# Altium footprint library Reflow3D1411sep.PcbLib: 657 footprints (part 15 of 42)
Each footprint in its own frame and in the unit in brackets; x right, y up, seen from the top. Pads: shape width x height; smd on the part's side, far side on the other; paste and mask are expansions set on the pad; w line width, h text height; cw(c..) or ccw(c..) is an arc to the next point about the centre after c.
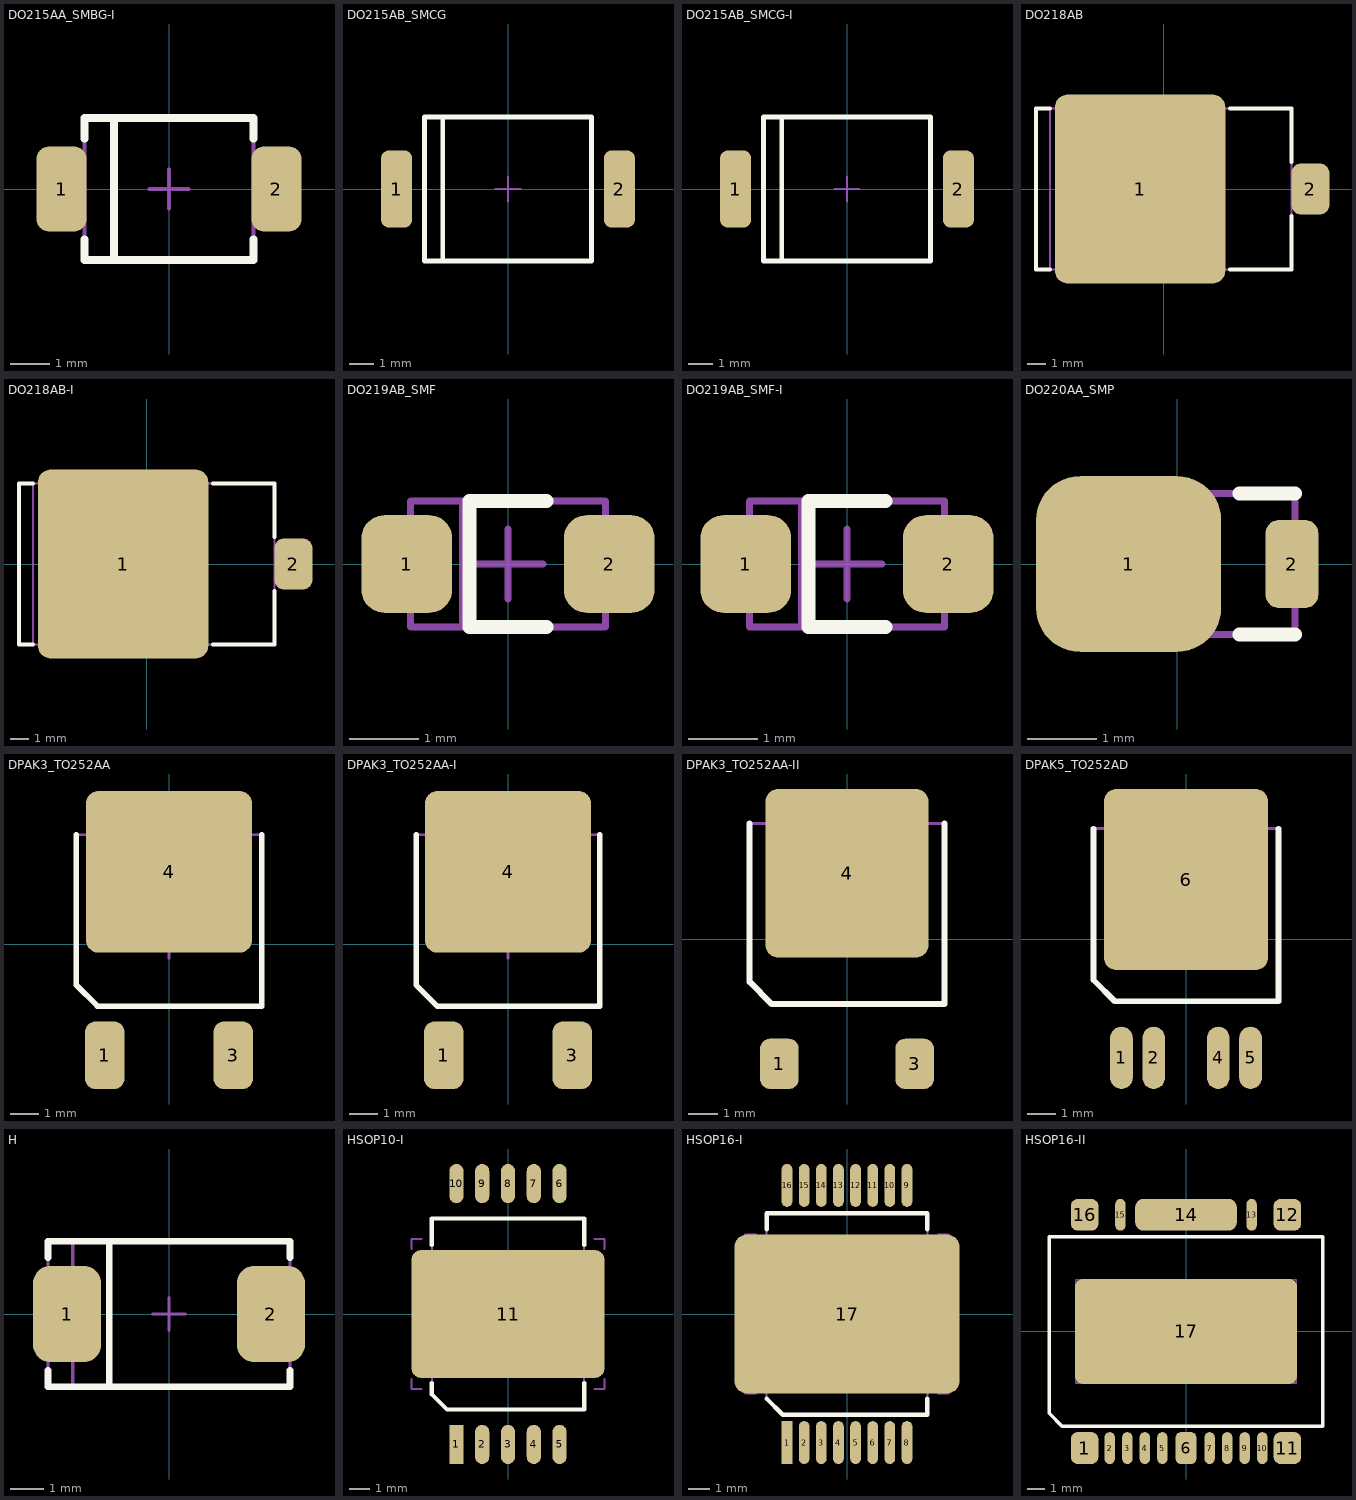
[diagram p14: the footprints below, top view; thin cyan lines are the x and y axes]

## DO215AA_SMBG-I [mm] "www.vishay.com, 88456.pdf; www.jedec.org, DO-215D.PDF"
height 2.3
pads (2):
  rrect50% 1.27x2.16 smd mask+0.075: 1(-2.73,0) 2(2.73,0)
Top Overlay:
  lines w0.2: -2.15,-1.275 -2.15,-1.8 2.15,-1.8 2.15,-1.275 ; -2.15,1.275 -2.15,1.8 2.15,1.8 2.15,1.275 ; -1.4,-1.8 -1.4,1.8
Mechanical 13:
  lines w0.1: -1.4,-1.8 -1.4,1.8 ; -2.15,-1.8 2.15,-1.8 2.15,1.8 -2.15,1.8 -2.15,-1.8
Mechanical 15:
  lines w0.1: -0.5,0 0.5,0 ; 0,-0.5 0,0.5
3D body: height 2.65, standoff 0, extent -2.3,-1.975 2.3,1.975

## DO215AB_SMCG [mm] "www.vishay.com, 88457.pdf"
height 2.28
pads (2):
  rrect50% 1.27x3.17 smd mask+0.075: 1(-4.57,0) 2(4.57,0)
Top Overlay:
  lines w0.2: -2.675,-2.95 -2.675,2.95 ; -3.43,-2.95 -3.43,2.95 3.43,2.95 3.43,-2.95 -3.43,-2.95
Mechanical 13:
  lines w0.1: -2.68,-2.95 -2.68,2.95 ; -3.43,-2.95 -3.43,2.95 3.43,2.95 3.43,-2.95 -3.43,-2.95
Mechanical 15:
  lines w0.1: -0.5,0 0.5,0 ; 0,-0.5 0,0.5
3D body: height 2.61, standoff 0, extent -3.555,-3.11 3.555,3.11

## DO215AB_SMCG-I [mm] "www.vishay.com, 88457.pdf; www.jedec.org, DO-214D.PDF"
height 2.3
pads (2):
  rrect50% 1.27x3.17 smd mask+0.075: 1(-4.57,0) 2(4.57,0)
Top Overlay:
  lines w0.2: -2.675,-2.95 -2.675,2.95 ; -3.425,-2.95 -3.425,2.95 3.425,2.95 3.425,-2.95 -3.425,-2.95
Mechanical 13:
  lines w0.1: -2.675,-2.95 -2.675,2.95 ; -3.425,-2.95 -3.425,2.95 3.425,2.95 3.425,-2.95 -3.425,-2.95
Mechanical 15:
  lines w0.1: -0.5,0 0.5,0 ; 0,-0.5 0,0.5
3D body: height 2.65, standoff 0, extent -3.575,-3.125 3.575,3.125

## DO218AB [mm] "www.vishay.com, sm6a27.pdf"
height 4.85
pads (2):
  rrect15% 9x10 smd mask+0.075: 1(-1.25,0)
  rrect50% 2x2.7 smd mask+0.075: 2(7.75,0)
Top Overlay:
  lines w0.2: -6,-4.25 -6.75,-4.25 -6.75,4.25 -6,4.25 ; 3.5,-4.25 6.75,-4.25 6.75,-1.425 ; 3.5,4.25 6.75,4.25 6.75,1.425
Mechanical 13:
  lines w0.1: -6,-4.25 -6,4.25 ; -6.75,-4.25 -6.75,4.25 6.75,4.25 6.75,-4.25 -6.75,-4.25
Mechanical 15:
  lines w0.1: -0.5,0 0.5,0 ; 0,-0.5 0,0.5
3D body: height 5, standoff 0, extent -6.85,-4.35 6.85,4.35

## DO218AB-I [mm] "www.vishay.com, sm6a27.pdf; www.jedec.org, DO-218b.pdf"
height 5
pads (2):
  rrect15% 9x10 smd mask+0.075: 1(-1.25,0)
  rrect50% 2x2.7 smd mask+0.075: 2(7.75,0)
Top Overlay:
  lines w0.2: -6,-4.25 -6.75,-4.25 -6.75,4.25 -6,4.25 ; 3.5,-4.25 6.75,-4.25 6.75,-1.425 ; 3.5,4.25 6.75,4.25 6.75,1.425
Mechanical 13:
  lines w0.1: -6,-4.25 -6,4.25 ; -6.75,-4.25 6.75,-4.25 6.75,4.25 -6.75,4.25 -6.75,-4.25
Mechanical 15:
  lines w0.1: -0.5,0 0.5,0 ; 0,-0.5 0,0.5
3D body: height 5.7, standoff 0, extent -6.9,-4.4 6.9,4.4

## DO219AB_SMF [mm] "www.vishay.com, sl02m.pdf"
height 0.98
pads (2):
  rrect50% 1.3x1.4 smd mask+0.075: 1(-1.45,0) 2(1.45,0)
Top Overlay:
  lines w0.2: 0.55,-0.9 -0.55,-0.9 -0.55,0.9 0.55,0.9
Mechanical 13:
  lines w0.1: -0.65,-0.9 -0.65,0.9 ; -1.4,-0.9 -1.4,0.9 1.4,0.9 1.4,-0.9 -1.4,-0.9
Mechanical 15:
  lines w0.1: -0.5,0 0.5,0 ; 0,-0.5 0,0.5
3D body: height 1.08, standoff 0, extent -1.45,-0.95 1.45,0.95

## DO219AB_SMF-I [mm] "www.vishay.com, sl02m.pdf; www.jedec.org, do-219b.pdf"
height 0.98
pads (2):
  rrect50% 1.3x1.4 smd mask+0.075: 1(-1.45,0) 2(1.45,0)
Top Overlay:
  lines w0.2: 0.55,-0.9 -0.55,-0.9 -0.55,0.9 0.55,0.9
Mechanical 13:
  lines w0.1: -0.65,-0.9 -0.65,0.9 ; -1.4,-0.9 1.4,-0.9 1.4,0.9 -1.4,0.9 -1.4,-0.9
Mechanical 15:
  lines w0.1: -0.5,0 0.5,0 ; 0,-0.5 0,0.5
3D body: height 1.15, standoff 0, extent -1.45,-0.95 1.45,0.95

## DO220AA_SMP [mm] "www.vishay.com, es1pb.pdf; www.jedec.org, DO-220B.pdf"
height 1
pads (2):
  rrect50% 2.67x2.54 smd mask+0.075: 1(-0.7,0)
  rrect50% 0.76x1.27 smd mask+0.075: 2(1.655,0)
Top Overlay:
  lines w0.2: 0.9,-1.015 1.7,-1.015 ; 0.9,1.015 1.7,1.015
Mechanical 13:
  lines w0.1: -0.95,-1.015 -0.95,1.015 ; -1.7,-1.015 -1.7,1.015 1.7,1.015 1.7,-1.015 -1.7,-1.015
Mechanical 15:
  lines w0.1: -0.5,0 0.5,0 ; 0,-0.5 0,0.5
3D body: height 1.15, standoff 0, extent -1.805,-1.09 1.805,1.09

## DPAK3_TO252AA [mm] "www.nxp.com, sot428_po.pdf, SOT428_fr.pdf"
height 2.3
pads (3):
  rrect50% 1.4x2.4 smd paste-25.4 mask+0.05: 1(-2.285,-3.95) 3(2.285,-3.95)
  rrect15% 5.9x5.75 smd paste-25.4 mask+0.05: 4(0,2.575)
Top Overlay:
  lines w0.2: -3.3,3.9 -3.3,-1.45 -2.55,-2.2 3.3,-2.2 3.3,3.9
Top Paste:
  region: -1.635,-4.1 -2.935,-4.1 -2.935,-5.1 -1.635,-5.1
  region: -1.1,0.75 -2.9,0.75 -2.9,-0.25 -1.1,-0.25
  region: -1.635,-2.8 -2.935,-2.8 -2.935,-3.8 -1.635,-3.8
  region: 2.935,-2.8 1.635,-2.8 1.635,-3.8 2.935,-3.8
  region: 2.935,-4.1 1.635,-4.1 1.635,-5.1 2.935,-5.1
  region: 0.9,0.75 -0.9,0.75 -0.9,-0.25 0.9,-0.25
  region: 2.9,0.75 1.1,0.75 1.1,-0.25 2.9,-0.25
  region: 2.9,5.4 1.1,5.4 1.1,4.4 2.9,4.4
  region: 0.9,5.4 -0.9,5.4 -0.9,4.4 0.9,4.4
  region: -1.1,5.4 -2.9,5.4 -2.9,4.4 -1.1,4.4
  region: 2.9,3.075 1.1,3.075 1.1,2.075 2.9,2.075
  region: 0.9,3.075 -0.9,3.075 -0.9,2.075 0.9,2.075
  region: -1.1,3.075 -2.9,3.075 -2.9,2.075 -1.1,2.075
Mechanical 13:
  lines w0.1: -3.3,-1.45 -3.3,3.9 3.3,3.9 3.3,-2.2 -2.55,-2.2 -3.3,-1.45
Mechanical 15:
  lines w0.1: -0.5,0 0.5,0 ; 0,-0.5 0,0.5
3D body: height 2.38, standoff 0, extent -3.365,-2.26 3.365,3.96

## DPAK3_TO252AA-I [mm] "www.nxp.com, SOT428_fr.pdf; www.onsemi.com, 369AA.PDF; www.jedec.org, TO-252E.pdf"
height 2.28
pads (3):
  rrect50% 1.4x2.4 smd paste-25.4 mask+0.05: 1(-2.285,-3.95) 3(2.285,-3.95)
  rrect15% 5.9x5.75 smd paste-25.4 mask+0.05: 4(0,2.575)
Top Overlay:
  lines w0.2: -3.27,3.9 -3.27,-1.45 -2.52,-2.2 3.27,-2.2 3.27,3.9
Top Paste:
  region: -1.635,-4.1 -2.935,-4.1 -2.935,-5.1 -1.635,-5.1
  region: -1.1,0.75 -2.9,0.75 -2.9,-0.25 -1.1,-0.25
  region: -1.635,-2.8 -2.935,-2.8 -2.935,-3.8 -1.635,-3.8
  region: 2.935,-2.8 1.635,-2.8 1.635,-3.8 2.935,-3.8
  region: 2.935,-4.1 1.635,-4.1 1.635,-5.1 2.935,-5.1
  region: 0.9,0.75 -0.9,0.75 -0.9,-0.25 0.9,-0.25
  region: 2.9,0.75 1.1,0.75 1.1,-0.25 2.9,-0.25
  region: 2.9,5.4 1.1,5.4 1.1,4.4 2.9,4.4
  region: 0.9,5.4 -0.9,5.4 -0.9,4.4 0.9,4.4
  region: -1.1,5.4 -2.9,5.4 -2.9,4.4 -1.1,4.4
  region: 2.9,3.075 1.1,3.075 1.1,2.075 2.9,2.075
  region: 0.9,3.075 -0.9,3.075 -0.9,2.075 0.9,2.075
  region: -1.1,3.075 -2.9,3.075 -2.9,2.075 -1.1,2.075
Mechanical 13:
  lines w0.1: -3.27,-1.45 -3.27,3.9 3.27,3.9 3.27,-2.2 -2.52,-2.2 -3.27,-1.45
Mechanical 15:
  lines w0.1: -0.5,0 0.5,0 ; 0,-0.5 0,0.5
3D body: height 2.38, standoff 0, extent -3.365,-2.26 3.365,3.96

## DPAK3_TO252AA-II [mm] "www.national.com, td03b.pdf; www.jedec.org, TO-252E.pdf; www.onsemi.com, SOLDERRM-D.PDF"
height 2.3
pads (3):
  rrect50% 1.3x1.7 smd mask+0.075: 1(-2.285,-4.22) 3(2.285,-4.22)
  rrect15% 5.5x5.7 smd paste-25.4 mask+0.075: 4(0,2.22)
Top Overlay:
  lines w0.2: -3.29,3.9 -3.29,-1.45 -2.54,-2.2 3.29,-2.2 3.29,3.9
Top Paste:
  region: -0.75,4.97 -2.65,4.97 -2.65,2.97 -0.75,2.97
  region: 2.65,4.97 0.75,4.97 0.75,2.97 2.65,2.97
  region: 2.65,1.47 0.75,1.47 0.75,-0.53 2.65,-0.53
  region: -0.75,1.47 -2.65,1.47 -2.65,-0.53 -0.75,-0.53
Mechanical 13:
  lines w0.1: -3.29,-1.45 -3.29,3.9 3.29,3.9 3.29,-2.2 -2.54,-2.2 -3.29,-1.45
Mechanical 15:
  lines w0.1: -0.5,0 0.5,0 ; 0,-0.5 0,0.5
3D body: height 2.38, standoff 0, extent -3.365,-2.26 3.365,3.96

## DPAK5_TO252AD [mm] "www.onsemi.com, 175AA.PDF, SOLDERRM-D.PDF; www.jedec.org, TO-252E.pdf"
height 2.28
pads (5):
  oval 0.8x2.2 smd mask+0.075: 1(-2.28,-4.2) 2(-1.14,-4.2) 4(1.14,-4.2) 5(2.28,-4.2)
  rrect15% 5.8x6.4 smd paste-25.4 mask+0.075: 6(0,2.1)
Top Overlay:
  lines w0.2: -3.27,3.9 -3.27,-1.45 -2.52,-2.2 3.27,-2.2 3.27,3.9
Top Paste:
  region: -2.8,1.3 -2.8,-1 -0.8,-1 -0.8,1.3
  region: 0.8,1.3 0.8,-1 2.8,-1 2.8,1.3
  region: 0.8,5.2 0.8,2.9 2.8,2.9 2.8,5.2
  region: -2.8,5.2 -2.8,2.9 -0.8,2.9 -0.8,5.2
Mechanical 13:
  lines w0.1: -3.27,-1.45 -3.27,3.9 3.27,3.9 3.27,-2.2 -2.52,-2.2 -3.27,-1.45
Mechanical 15:
  lines w0.1: -0.5,0 0.5,0 ; 0,-0.5 0,0.5
3D body: height 2.38, standoff 0, extent -3.365,-2.26 3.365,3.96

## H [mm] "www.nec-tokin.com, capacitors.pdf; http://www.ncc-matsuo.co.jp, 267m.pdf"
height 4.1
pads (2):
  rrect50% 2.05x2.9 smd mask+0.075: 1(-3.075,0) 2(3.075,0)
Top Overlay:
  lines w0.2: -3.65,-1.7 -3.65,-2.2 3.65,-2.2 3.65,-1.7 ; -3.65,1.7 -3.65,2.2 3.65,2.2 3.65,1.7 ; -1.8,-2.2 -1.8,2.2
Mechanical 13:
  lines w0.1: -2.9,-2.2 -2.9,2.2 ; -3.65,-2.2 3.65,-2.2 3.65,2.2 -3.65,2.2 -3.65,-2.2
Mechanical 15:
  lines w0.1: -0.5,0 0.5,0 ; 0,-0.5 0,0.5
3D body: height 4.3, standoff 0, extent -3.75,-2.3 3.75,2.3

## HSOP10-I [mm] "www.st.com, CD00001316.pdf; www.jedec.org, jesd51-5.pdf"
height 3.55
pads (11):
  rect 0.7x1.93 smd mask+0.075: 1(-2.54,-6.415)
  oval 0.7x1.93 smd mask+0.075: 2(-1.27,-6.415) 3(0,-6.415) 4(1.27,-6.415) 5(2.54,-6.415) 6(2.54,6.415) 7(1.27,6.415) 8(0,6.415) 9(-1.27,6.415) 10(-2.54,6.415)
  rrect15% 9.5x6.3 smd paste-25.4 mask+0.075: 11(0,0)
Top Overlay:
  lines w0.2: -3.75,-3.4 -3.75,-3.95 -3,-4.7 3.75,-4.7 3.75,-3.4 ; -3.75,3.4 -3.75,4.7 3.75,4.7 3.75,3.4
Top Paste:
  region: 0.5,0.5 -0.5,0.5 -0.5,-0.5 0.5,-0.5
  region: 0.5,1.7 -0.5,1.7 -0.5,0.7 0.5,0.7
  region: 0.5,2.9 -0.5,2.9 -0.5,1.9 0.5,1.9
  region: 0.5,-0.7 -0.5,-0.7 -0.5,-1.7 0.5,-1.7
  region: 0.5,-1.9 -0.5,-1.9 -0.5,-2.9 0.5,-2.9
  region: 1.7,-1.9 0.7,-1.9 0.7,-2.9 1.7,-2.9
  region: 1.7,-0.7 0.7,-0.7 0.7,-1.7 1.7,-1.7
  region: 1.7,2.9 0.7,2.9 0.7,1.9 1.7,1.9
  region: 1.7,1.7 0.7,1.7 0.7,0.7 1.7,0.7
  region: 1.7,0.5 0.7,0.5 0.7,-0.5 1.7,-0.5
  region: 2.9,-1.9 1.9,-1.9 1.9,-2.9 2.9,-2.9
  region: 2.9,-0.7 1.9,-0.7 1.9,-1.7 2.9,-1.7
  region: 2.9,2.9 1.9,2.9 1.9,1.9 2.9,1.9
  region: 2.9,1.7 1.9,1.7 1.9,0.7 2.9,0.7
  region: 2.9,0.5 1.9,0.5 1.9,-0.5 2.9,-0.5
  region: -0.7,-1.9 -1.7,-1.9 -1.7,-2.9 -0.7,-2.9
  region: -0.7,-0.7 -1.7,-0.7 -1.7,-1.7 -0.7,-1.7
  region: -0.7,2.9 -1.7,2.9 -1.7,1.9 -0.7,1.9
  region: -0.7,1.7 -1.7,1.7 -1.7,0.7 -0.7,0.7
  region: -0.7,0.5 -1.7,0.5 -1.7,-0.5 -0.7,-0.5
  region: -1.9,-1.9 -2.9,-1.9 -2.9,-2.9 -1.9,-2.9
  region: -1.9,-0.7 -2.9,-0.7 -2.9,-1.7 -1.9,-1.7
  region: -1.9,2.9 -2.9,2.9 -2.9,1.9 -1.9,1.9
  region: -1.9,1.7 -2.9,1.7 -2.9,0.7 -1.9,0.7
  region: -1.9,0.5 -2.9,0.5 -2.9,-0.5 -1.9,-0.5
  region: -3.1,-1.9 -4.1,-1.9 -4.1,-2.9 -3.1,-2.9
  region: -3.1,-0.7 -4.1,-0.7 -4.1,-1.7 -3.1,-1.7
  region: -3.1,2.9 -4.1,2.9 -4.1,1.9 -3.1,1.9
  region: -3.1,1.7 -4.1,1.7 -4.1,0.7 -3.1,0.7
  region: -3.1,0.5 -4.1,0.5 -4.1,-0.5 -3.1,-0.5
  region: 4.1,-1.9 3.1,-1.9 3.1,-2.9 4.1,-2.9
  region: 4.1,-0.7 3.1,-0.7 3.1,-1.7 4.1,-1.7
  region: 4.1,2.9 3.1,2.9 3.1,1.9 4.1,1.9
  region: 4.1,1.7 3.1,1.7 3.1,0.7 4.1,0.7
  region: 4.1,0.5 3.1,0.5 3.1,-0.5 4.1,-0.5
Mechanical 13:
  lines w0.1: -4.75,-3.2 -4.75,-3.7 -4.25,-3.7 ; -4.75,3.2 -4.75,3.7 -4.25,3.7 ; 4.25,-3.7 4.75,-3.7 4.75,-3.2 ; 4.25,3.7 4.75,3.7 4.75,3.2 ; -3.75,-3.95 -3,-4.7 3.75,-4.7 3.75,4.7 -3.75,4.7 -3.75,-3.95
Mechanical 15:
  lines w0.1: -0.5,0 0.5,0 ; 0,-0.5 0,0.5
3D body: height 3.75, standoff 0, extent -3.8,-4.75 3.8,4.75

## HSOP16-I [mm] "www.st.com, CD00269984.pdf; www.jedec.org, jesd51-5.pdf"
height 3.55
pads (17):
  rect 0.5x2 smd mask+0.075: 1(-2.8,-6)
  oval 0.5x2 smd mask+0.075: 2(-2,-6) 3(-1.2,-6) 4(-0.4,-6) 5(0.4,-6) 6(1.2,-6) 7(2,-6) 8(2.8,-6) 9(2.8,6) 10(2,6) 11(1.2,6) 12(0.4,6) 13(-0.4,6) 14(-1.2,6) 15(-2,6) 16(-2.8,6)
  rrect15% 10.5x7.4 smd paste-25.4 mask+0.075: 17(0,0)
Top Overlay:
  lines w0.2: -3.75,-3.95 -3,-4.7 3.75,-4.7 3.75,-3.95 ; -3.75,3.95 -3.75,4.7 3.75,4.7 3.75,3.95
Top Paste:
  region: 0.5,0.5 -0.5,0.5 -0.5,-0.5 0.5,-0.5
  region: 0.5,1.7 -0.5,1.7 -0.5,0.7 0.5,0.7
  region: 0.5,2.9 -0.5,2.9 -0.5,1.9 0.5,1.9
  region: 0.5,-0.7 -0.5,-0.7 -0.5,-1.7 0.5,-1.7
  region: 0.5,-1.9 -0.5,-1.9 -0.5,-2.9 0.5,-2.9
  region: 1.7,-1.9 0.7,-1.9 0.7,-2.9 1.7,-2.9
  region: 1.7,-0.7 0.7,-0.7 0.7,-1.7 1.7,-1.7
  region: 1.7,2.9 0.7,2.9 0.7,1.9 1.7,1.9
  region: 1.7,1.7 0.7,1.7 0.7,0.7 1.7,0.7
  region: 1.7,0.5 0.7,0.5 0.7,-0.5 1.7,-0.5
  region: 2.9,-1.9 1.9,-1.9 1.9,-2.9 2.9,-2.9
  region: 2.9,-0.7 1.9,-0.7 1.9,-1.7 2.9,-1.7
  region: 2.9,2.9 1.9,2.9 1.9,1.9 2.9,1.9
  region: 2.9,1.7 1.9,1.7 1.9,0.7 2.9,0.7
  region: 2.9,0.5 1.9,0.5 1.9,-0.5 2.9,-0.5
  region: -0.7,-1.9 -1.7,-1.9 -1.7,-2.9 -0.7,-2.9
  region: -0.7,-0.7 -1.7,-0.7 -1.7,-1.7 -0.7,-1.7
  region: -0.7,2.9 -1.7,2.9 -1.7,1.9 -0.7,1.9
  region: -0.7,1.7 -1.7,1.7 -1.7,0.7 -0.7,0.7
  region: -0.7,0.5 -1.7,0.5 -1.7,-0.5 -0.7,-0.5
  region: -1.9,-1.9 -2.9,-1.9 -2.9,-2.9 -1.9,-2.9
  region: -1.9,-0.7 -2.9,-0.7 -2.9,-1.7 -1.9,-1.7
  region: -1.9,2.9 -2.9,2.9 -2.9,1.9 -1.9,1.9
  region: -1.9,1.7 -2.9,1.7 -2.9,0.7 -1.9,0.7
  region: -1.9,0.5 -2.9,0.5 -2.9,-0.5 -1.9,-0.5
  region: -3.1,-1.9 -4.1,-1.9 -4.1,-2.9 -3.1,-2.9
  region: -3.1,-0.7 -4.1,-0.7 -4.1,-1.7 -3.1,-1.7
  region: -3.1,2.9 -4.1,2.9 -4.1,1.9 -3.1,1.9
  region: -3.1,1.7 -4.1,1.7 -4.1,0.7 -3.1,0.7
  region: -3.1,0.5 -4.1,0.5 -4.1,-0.5 -3.1,-0.5
  region: 4.1,-1.9 3.1,-1.9 3.1,-2.9 4.1,-2.9
  region: 4.1,-0.7 3.1,-0.7 3.1,-1.7 4.1,-1.7
  region: 4.1,2.9 3.1,2.9 3.1,1.9 4.1,1.9
  region: 4.1,1.7 3.1,1.7 3.1,0.7 4.1,0.7
  region: 4.1,0.5 3.1,0.5 3.1,-0.5 4.1,-0.5
Mechanical 13:
  lines w0.1: -4.75,-3.2 -4.75,-3.7 -4.25,-3.7 ; -4.75,3.2 -4.75,3.7 -4.25,3.7 ; 4.25,-3.7 4.75,-3.7 4.75,-3.2 ; 4.25,3.7 4.75,3.7 4.75,3.2 ; -3.75,-3.95 -3,-4.7 3.75,-4.7 3.75,4.7 -3.75,4.7 -3.75,-3.95
Mechanical 15:
  lines w0.1: -0.5,0 0.5,0 ; 0,-0.5 0,0.5
3D body: height 3.7, standoff 0, extent -3.8,-4.75 3.8,4.75

## HSOP16-II [mm] "www.nxp.com, sot822-1_po.pdf, SOT822-1_fr.pdf"
height 3.3
pads (17):
  rrect50% 1.6x1.85 smd mask+0.075: 1(-5.89,-6.775) 11(5.89,-6.775) 12(5.89,6.775) 16(-5.89,6.775)
  oval 0.6x1.85 smd mask+0.075: 2(-4.43,-6.775) 3(-3.41,-6.775) 4(-2.39,-6.775) 5(-1.37,-6.775) 7(1.37,-6.775) 8(2.39,-6.775) 9(3.41,-6.775) 10(4.43,-6.775) 13(3.81,6.775) 15(-3.81,6.775)
  rrect50% 1.2x1.85 smd mask+0.075: 6(0,-6.775)
  rrect50% 5.9x1.85 smd paste-25.4 mask+0.075: 14(0,6.775)
  rrect15% 12.9x6.1 smd paste-25.4 mask-0.075: 17(0,0)
Top Overlay:
  lines w0.2: -7.95,-4.75 -7.2,-5.5 7.95,-5.5 7.95,5.5 -7.95,5.5 -7.95,-4.75
Top Paste:
  region: 0.55,0.55 -0.55,0.55 -0.55,-0.55 0.55,-0.55
  region: 2.925,7.675 0.225,7.675 0.225,5.875 2.925,5.875
  region: -0.225,7.675 -2.925,7.675 -2.925,5.875 -0.225,5.875
  region: 2.05,0.55 0.95,0.55 0.95,-0.55 2.05,-0.55
  region: 0.55,2.05 -0.55,2.05 -0.55,0.95 0.55,0.95
  region: 2.05,2.05 0.95,2.05 0.95,0.95 2.05,0.95
  region: 0.55,-0.95 -0.55,-0.95 -0.55,-2.05 0.55,-2.05
  region: 2.05,-0.95 0.95,-0.95 0.95,-2.05 2.05,-2.05
  region: -0.95,-0.95 -2.05,-0.95 -2.05,-2.05 -0.95,-2.05
  region: -0.95,2.05 -2.05,2.05 -2.05,0.95 -0.95,0.95
  region: -0.95,0.55 -2.05,0.55 -2.05,-0.55 -0.95,-0.55
  region: -2.45,-0.95 -3.55,-0.95 -3.55,-2.05 -2.45,-2.05
  region: -2.45,2.05 -3.55,2.05 -3.55,0.95 -2.45,0.95
  region: -2.45,0.55 -3.55,0.55 -3.55,-0.55 -2.45,-0.55
  region: 3.55,-0.95 2.45,-0.95 2.45,-2.05 3.55,-2.05
  region: 3.55,2.05 2.45,2.05 2.45,0.95 3.55,0.95
  region: 3.55,0.55 2.45,0.55 2.45,-0.55 3.55,-0.55
Mechanical 13:
  lines w0.1: -6.4,-2.5 -6.4,-3 -5.9,-3 ; -6.4,2.5 -6.4,3 -5.9,3 ; 5.9,-3 6.4,-3 6.4,-2.5 ; 5.9,3 6.4,3 6.4,2.5 ; -7.95,-4.75 -7.95,5.5 7.95,5.5 7.95,-5.5 -7.2,-5.5 -7.95,-4.75
Mechanical 15:
  lines w0.1: -0.5,0 0.5,0 ; 0,-0.5 0,0.5
3D body: height 3.6, standoff 0, extent -8,-5.55 8,5.55